# Altium footprint library Discretes.PcbLib: 81 footprints (part 2 of 6)
Each footprint in its own frame and in the unit in brackets; x right, y up, seen from the top. Pads: shape width x height; smd on the part's side, far side on the other; paste and mask are expansions set on the pad; w line width, h text height; cw(c..) or ccw(c..) is an arc to the next point about the centre after c.
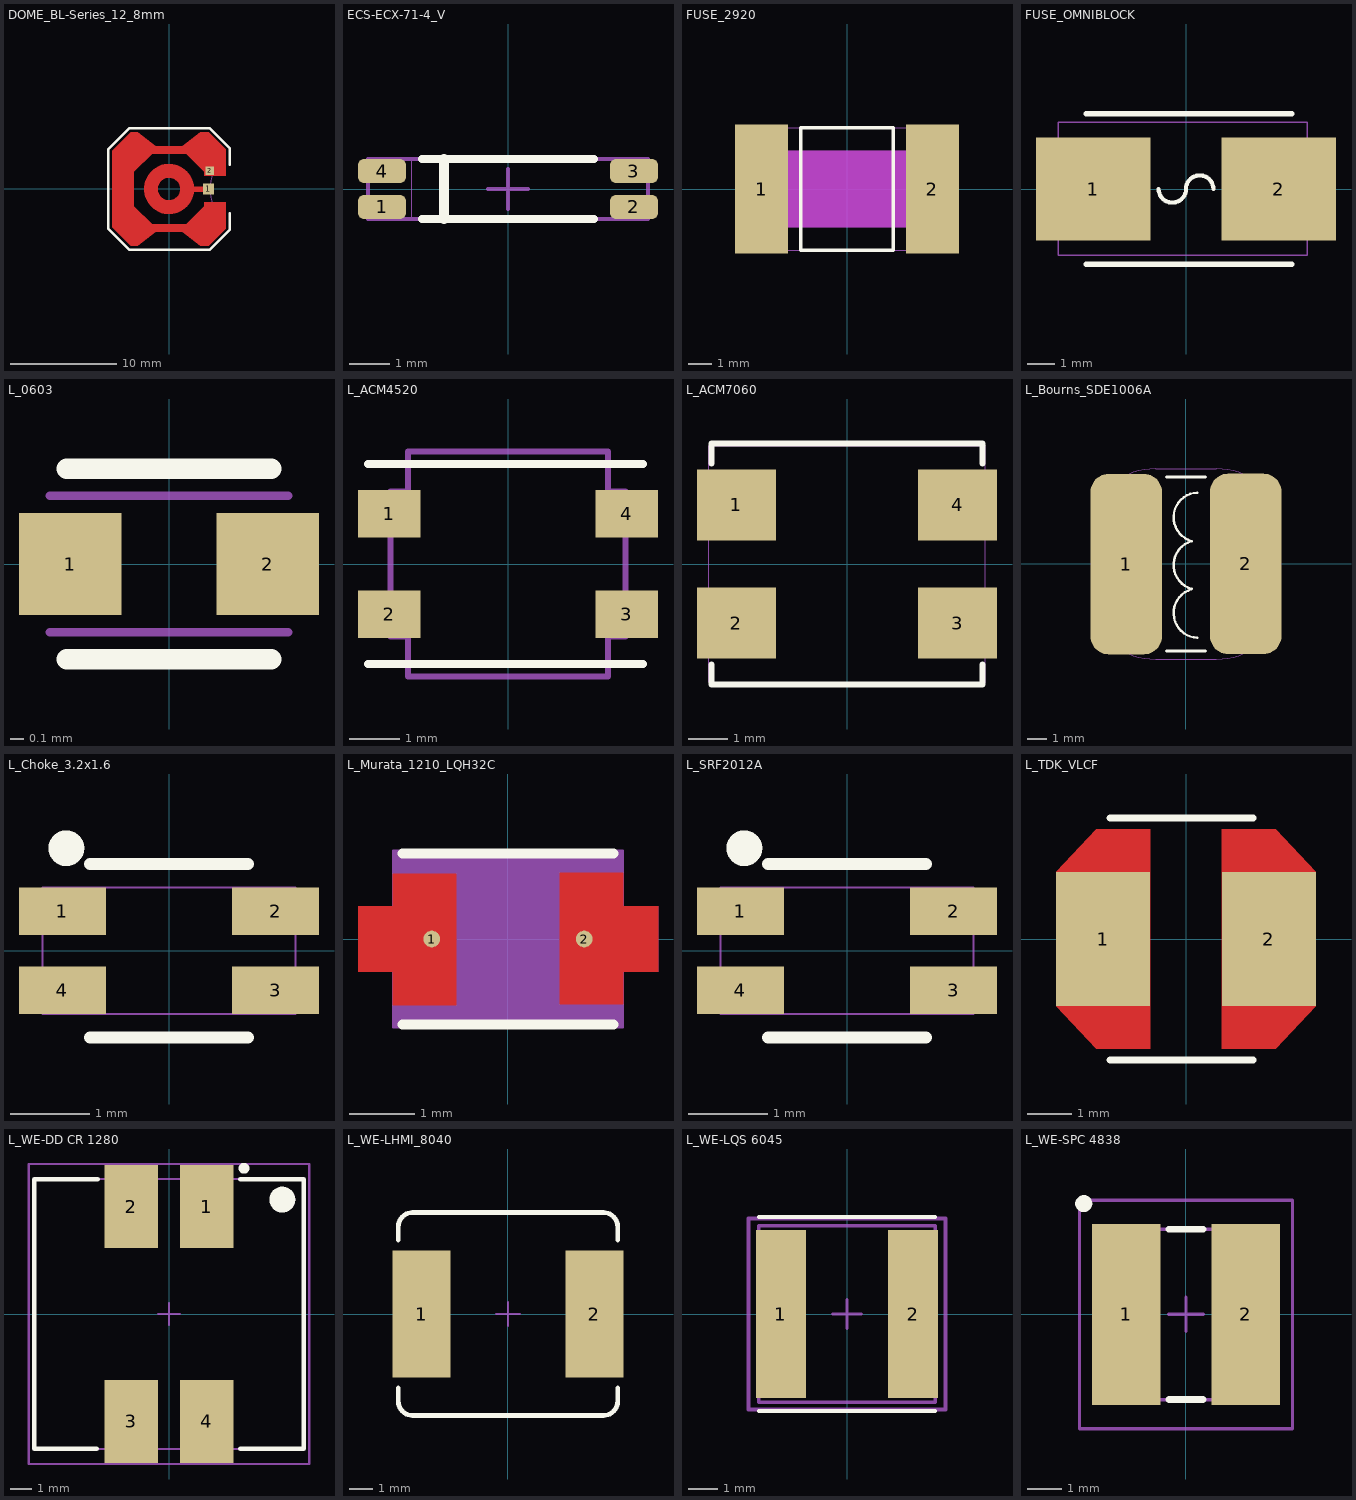
[diagram p1: the footprints below, top view; thin cyan lines are the x and y axes]

## DOME_BL-Series_12_8mm [mm] "Tactile Dome Switch wLED Hole 12mm and 8mm"
height 0.56
pads (2):
  rect 1x1 smd paste-1: 1(3.7,0)
  rect 0.8x0.8 smd paste-0.8 mask-0.8: 2(3.8,1.7)
Top Layer:
  circle w1.3: c0,0 r1.7
  rectangle: 2.1,-0.3 3.6,0.25
  region: 177 vertices and 0 holes, not listed, extent -5.313,-5.313 5.313,5.313
Top Overlay:
  lines w0.25: 5.7,-2.3 5.7,-3.8 3.8,-5.7 -3.7,-5.7 -5.7,-3.7 -5.7,3.7 -3.7,5.7 3.8,5.7 5.7,3.8 5.7,2.3
Top Solder:
  circle w4: c0,0 r0.5
  region: 4.3,0.6 1.9,0.6 1.9,-0.6 4.3,-0.6
Mechanical 1:
  circle w0.025: c0,0 r1.2
  lines w0.025: -4.998,-3.217 -3.216,-4.998 cw(c-0.004,-8.921) 3.225,-5.011 ; -4.99,-3.225 ccw(c-8.957,-0.01) -5.016,3.237 -3.238,5.015 ; -3.216,4.998 ccw(c-0.004,8.92) 3.225,5.011 ; 3.216,4.998 5.016,3.237 ccw(c8.96,0.003) 5.011,-3.225 ; 3.237,-5.016 5.016,-3.238
  text ".Designator" at -2.725,6.05 h1.52
3D body "DOME-BL12280.STEP": height 0.61, standoff 0, extent -5.016,-5.016 5.016,5.016
3D body "DOME-BL08260.STEP": height 0.51, standoff 0, extent -3.561,-3.561 3.561,3.561

## ECS-ECX-71-4_V [mm] "SMT Crystal, 4-Leads, Body 7x1.5mm (max)"
pads (4):
  rrect50% 1.2x0.6 smd: 1(-3.15,-0.45) 2(3.15,-0.45) 3(3.15,0.45) 4(-3.15,0.45)
Top Overlay:
  lines w0.2: -2.15,-0.75 2.15,-0.75 ; -2.15,0.75 2.15,0.75
  lines w0.25: -1.6,-0.75 -1.6,0.75
Mechanical 1:
  lines w0.025: -2.4,-0.75 -2.4,0.75
  lines w0.1: -3.5,-0.75 -3.5,0.75 3.5,0.75 3.5,-0.75 -3.5,-0.75
  text ".Designator" at -1.346,-0.242 h0.76
Mechanical 15:
  lines w0.1: -0.5,0 0.5,0 ; 0,-0.5 0,0.5
3D body: height 1.4, standoff 0, extent -3.556,-0.749 3.414,0.737
3D body: height 0.3, standoff 0, extent -3.589,0.389 -3.198,0.668
3D body: height 0.3, standoff 0, extent -3.574,-0.681 -3.183,-0.401
3D body: height 0.3, standoff 0, extent 3.162,0.389 3.553,0.668
3D body: height 0.3, standoff 0, extent 3.162,-0.676 3.553,-0.396
3D body: height 1.41, standoff 1.39, extent -2.76,-0.49 -1.701,0.511
3D body: height 1.41, standoff 1.39, extent 1.617,-0.465 2.676,0.536

## FUSE_2920 [mm] "Resistor 2920 package"
height 0.711
pads (2):
  rect 2.3x5.6 smd: 1(-3.7,0) 2(3.7,0)
Top Overlay:
  lines w0.152: -2,-2.65 -2,2.65 2,2.65 2,-2.65 -2,-2.65
Mechanical 1:
  lines w0.025: -2.7,-2.65 -2.7,2.65 ; 2.7,-2.65 2.7,2.65 ; -3.85,-2.65 -3.85,2.65 3.85,2.65 3.85,-2.65 -3.85,-2.65
  text ".Designator" at -1.6,3.1 h1.27
Mechanical 11:
  pour cut-out: 3.429,-1.651 3.861,-1.651 3.861,1.651 3.429,1.651 -3.683,1.651 -3.861,1.651 -3.861,1.143 -3.861,-1.194 -3.861,-1.651 -3.81,-1.651
Mechanical 29 keep-out:
  region: 2.54,1.651 -2.54,1.651 -2.54,-1.651 2.54,-1.651
  region: -2.413,-1.651 2.413,-1.651 2.413,1.651 -2.413,1.651
3D body "FUSE-2920.step": height 1, standoff 0, extent -3.85,-2.65 3.85,2.65

## FUSE_OMNIBLOCK [mil] "Fuse, Omni block"
height 116
pads (2):
  rect 167x150 smd: 1(-135.5,0) 2(135.5,0)
Top Overlay:
  lines w6: -40,0 ccw(c-20,0) 0,0 cw(c20,0) 40,0
  lines w8: -145.5,-110 154.5,-110 ; -145.5,110 154.5,110
Mechanical 1:
  lines w2: -186.39,-96.84 176.91,-96.84 176.91,97.59 -186.39,97.59 -186.39,-96.84
  text ".Designator" at -75.5,-22 h60
3D body "OMNI-BLOK littelfuse.step": height 150, standoff 0, extent -199,-99.01 188,99.02

## L_0603 [mil] "Inductor 0603 package"
height 31.5
pads (2):
  rect 30x30 smd: 1(-29,0) 2(29,0)
Top Overlay:
  lines w6: -30,-28 30,-28 ; -30,28 30,28
Mechanical 1:
  lines w2.5: -35,-20 35,-20 ; -35,20 35,20
  text ".Designator" at -17.19,-13.78 h25
3D body "V0603.STEP": height 35.43, standoff 0, extent -31.49,-15.74 31.5,15.75

## L_ACM4520 [mm] "Common mode inductor 2 line"
height 2
pads (4):
  rect 1.25x0.95 smd: 1(-2.375,1) 2(-2.375,-1) 3(2.375,-1) 4(2.375,1)
Top Overlay:
  lines w0.152: -2.8,-2 2.7,-2 ; -2.8,2 2.7,2
Mechanical 1:
  lines w0.127: -2.35,-1.45 -2.35,1.45 -2,1.45 -2,2.25 2,2.25 2,1.45 2.35,1.45 2.35,-1.45 2,-1.45 2,-2.25 -2,-2.25 -2,-1.45 -2.35,-1.45
  text ".Designator" at -0.45,-0.2 h0.79
3D body: height 2, standoff 0, extent -2.35,-2.25 2.35,2.25

## L_ACM7060 [mm] "Common mode inductor 2 line"
height 3.5
pads (4):
  rect 2x1.8 smd: 1(-2.8,1.5) 2(-2.8,-1.5) 3(2.8,-1.5) 4(2.8,1.5)
Top Overlay:
  lines w0.152: -3.429,-2.54 -3.429,-3.048 3.429,-3.048 3.429,-2.54 ; -3.429,2.54 -3.429,3.048 3.429,3.048 3.429,2.54
Mechanical 1:
  lines w0.025: -3.5,-3 -3.5,3 3.5,3 3.5,-3 -3.5,-3 ; -3.5,-2.25 -2,-2.25 -2,-0.75 -3.5,-0.75 -3.5,-2.25 ; -3.5,0.75 -3.5,2.25 -2,2.25 -2,0.75 -3.5,0.75 ; 2,-2.25 3.5,-2.25 3.5,-0.75 2,-0.75 2,-2.25 ; 2,0.75 3.5,0.75 3.5,2.25 2,2.25 2,0.75
  text ".Designator" at -1.27,-0.254 h0.79
3D body "TDK_ACM7060.step": height 3.5, standoff 0, extent -3.5,-3 3.5,3

## L_Bourns_SDE1006A [mm] "Power Inductor  Bourns Serie  - SDE1006A -"
height 5.8
pads (2):
  rrect50% 3.77x9.5 smd: 1(-3.144,-0.007) 2(3.144,0.007)
Top Overlay:
  lines w0.127: 0.29,-1.332 ccw(c0.65,-2.584) 0.602,-3.886 ; 0.29,1.197 ccw(c0.65,-0.055) 0.307,-1.312 ; 0.307,1.2 cw(c0.65,2.457) 0.601,3.759
  lines w0.152: -1.016,-4.572 1.016,-4.572 ; -1.016,4.572 1.016,4.572
Mechanical 1:
  lines w0.025: -4.9,1.551 ccw(c-4.064,1.522) -4.064,0.686 cw(c-4.064,0.457) -3.835,0.457 -3.835,-0.457 cw(c-4.064,-0.457) -4.064,-0.686 ccw(c-4.064,-1.522) -4.9,-1.522 -4.9,-1.885 ccw(c-1.693,-1.793) -1.601,-5 1.601,-5 ; -4.9,1.552 -4.9,1.885 cw(c-1.693,1.793) -1.601,5 1.601,5 ; -1.575,5 1.601,5 cw(c1.693,1.793) 4.9,1.885 4.9,1.552 ; 1.601,-5 ccw(c1.693,-1.793) 4.9,-1.885 4.9,-1.522 ccw(c4.064,-1.522) 4.064,-0.686 cw(c4.064,-0.457) 3.835,-0.457 3.835,0.457 cw(c4.064,0.457) 4.064,0.686 ccw(c4.064,1.522) 4.9,1.551
  text ".Designator" at -2.565,-1.041 h1.52
3D body "Bourns_SRN1060.step": height 6.1, standoff 0, extent -4.9,-5 4.9,5

## L_Choke_3.2x1.6 [mm] "Common mode chip inductor 2 line"
height 1.6
pads (4):
  rect 1.1x0.6 smd: 1(-1.35,0.5) 2(1.35,0.5) 3(1.35,-0.5) 4(-1.35,-0.5)
Top Overlay:
  circle w0.254: c-1.3,1.3 r0.1
  lines w0.152: -1,-1.1 1,-1.1 ; -1,1.1 1,1.1
Mechanical 1:
  circle w0.254: c-1.2,0.5 r0.05
  lines w0.025: -1.6,-0.8 -1.6,0.8 1.6,0.8 1.6,-0.8 -1.6,-0.8
  text ".Designator" at -0.7,-0.3 h0.79
3D body: height 1.8, standoff 0, extent -1.6,-0.8 1.6,0.8

## L_Murata_1210_LQH32C [mil] "Chip power inductor"
height 87
pads (2):
  round 10 smd: 1(-45.59,0) 2(45.59,0)
Top Layer:
  region: 31.1,39.76 68.9,39.76 68.9,19.69 89.76,19.69 89.76,-19.68 68.9,-19.68 68.9,-38.98 31.1,-38.98
  region: -31.1,-39.76 -68.9,-39.76 -68.9,-19.68 -89.76,-19.68 -89.76,19.69 -68.9,19.69 -68.9,38.98 -31.1,38.98
Top Overlay:
  lines w6: -62.99,-51.18 62.99,-51.18 ; -62.99,51.18 62.99,51.18
Top Paste:
  region: 31.1,39.76 68.9,39.76 68.9,19.69 89.76,19.69 89.76,-19.68 68.9,-19.68 68.9,-38.98 31.1,-38.98
  region: -31.1,-39.76 -68.9,-39.76 -68.9,-19.68 -89.76,-19.68 -89.76,19.69 -68.9,19.69 -68.9,38.98 -31.1,38.98
Top Solder:
  region: 31.1,39.76 68.9,39.76 68.9,19.69 89.76,19.69 89.76,-19.68 68.9,-19.68 68.9,-38.98 31.1,-38.98
  region: -31.1,-39.76 -68.9,-39.76 -68.9,-19.68 -89.76,-19.68 -89.76,19.69 -68.9,19.69 -68.9,38.98 -31.1,38.98
Mechanical 1:
  lines w1: -68.9,-53.15 -51.18,-53.15 -45.28,-47.24 -25.59,-53.15 25.59,-53.15 45.28,-47.24 51.18,-53.15 68.9,-53.15 68.9,53.15 51.18,53.15 45.28,47.24 25.59,53.15 -25.59,53.15 -45.28,47.24 -51.18,53.15 -68.9,53.15 -68.9,-53.15 ; -51.18,-39.37 51.18,-39.37 51.18,39.37 -51.18,39.37 -51.18,-39.37
  text ".Designator" at -27.56,-15.75 h39.37
Mechanical 11:
  pour cut-out: -68.9,-53.15 68.9,-53.15 68.9,-19.68 89.76,-19.68 89.76,19.69 68.9,19.69 68.9,53.15 -68.9,53.15 -68.9,19.69 -89.76,19.69 -89.76,-19.68 -68.9,-19.68
3D body "LQH32M-1.step": height 76.77, standoff -1.97, extent -57.73,-48.73 68.25,49.7

## L_SRF2012A [mm] "Common mode chip inductor 2 line"
height 1.2
pads (4):
  rect 1.1x0.6 smd: 1(-1.35,0.5) 2(1.35,0.5) 3(1.35,-0.5) 4(-1.35,-0.5)
Top Overlay:
  circle w0.254: c-1.3,1.3 r0.1
  lines w0.152: -1,-1.1 1,-1.1 ; -1,1.1 1,1.1
Mechanical 1:
  circle w0.254: c-1.2,0.5 r0.05
  lines w0.025: -1.6,-0.8 -1.6,0.8 1.6,0.8 1.6,-0.8 -1.6,-0.8
  text ".Designator" at -0.7,-0.3 h0.79
3D body: height 1.8, standoff 0, extent -1.6,-0.8 1.6,0.8

## L_TDK_VLCF [mm] "Power inductor"
height 2
pads (2):
  rect 2.1x3 smd paste+0 mask+0: 1(-1.85,0) 2(1.85,0)
Top Layer:
  region: 0.8,2.45 2,2.45 2.9,1.5 2.9,-1.5 2,-2.45 0.8,-2.45
  region: -0.8,2.45 -2,2.45 -2.9,1.5 -2.9,-1.5 -2,-2.45 -0.8,-2.45
Top Overlay:
  lines w0.152: -1.7,-2.7 1.5,-2.7 ; -1.7,2.7 1.5,2.7
3D body: height 2, standoff 0, extent -2.625,-2.5 2.625,2.5

## L_WE-DD CR 1280 [mm] "SMD Inductor, 4-Leads, Body 12.5x12.5mm (max)"
height 8.5
pads (4):
  rect 2.5x3.85 smd: 1(1.75,4.975) 2(-1.75,4.975) 3(-1.75,-4.975) 4(1.75,-4.975)
Top Overlay:
  circle w0.6: c5.25,5.3 r0.3
  circle w0.25: c3.475,6.75 r0.125
  lines w0.2: -6.25,-6.25 -6.25,6.25 -3.3,6.25 ; -6.2,-6.25 -3.35,-6.25 ; 3.3,-6.25 6.25,-6.25 6.25,6.25 3.3,6.25
Mechanical 1:
  circle w0.1: c5.3,5.3 r0.5
  lines w0.1: -6.25,-6.25 -6.25,6.25 6.25,6.25 6.25,-6.25 -6.25,-6.25
Mechanical 15:
  lines w0.1: -0.5,0 0.5,0 ; 0,-0.5 0,0.5 ; -6.5,-6.95 -6.5,6.95 6.5,6.95 6.5,-6.95 -6.5,-6.95
3D body "WE-DD_1280_Crossed.stp": height 8.6, standoff 0, extent -6.25,-6.25 6.25,6.25

## L_WE-LHMI_8040 [mm] "SMD Power Inductor, body 9.2x8.5"
height 4
pads (2):
  rect 2.42x5.33 smd: 1(-3.62,0) 2(3.62,0)
Top Overlay:
  lines w0.2: -4.6,-3.1 -4.6,-3.65 ccw(c-4,-3.65) -4,-4.25 4,-4.25 ccw(c4,-3.65) 4.6,-3.65 4.6,-3.1 ; -4.6,3.1 -4.6,3.65 cw(c-4,3.65) -4,4.25 4,4.25 cw(c4,3.65) 4.6,3.65 4.6,3.1
Mechanical 15:
  lines w0.1: -0.5,0 0.5,0 ; 0,-0.5 0,0.5
3D body "IndLHMI_8040.stp": height 4, standoff 0, extent -4.725,-4.1 4.725,4.1

## L_WE-LQS 6045 [mm] "SMD Power Inductor, 2-Leads, Body 6.0x6.0mm"
height 4.5
pads (2):
  rect 1.7x5.7 smd: 1(-2.25,0) 2(2.25,0)
Top Overlay:
  lines w0.127: -3,-3.3 3,-3.3 ; -3,3.3 3,3.3
Mechanical 1:
  text ".Designator" at -0.875,-0.475 h1
Mechanical 13:
  lines w0.127: -3,-3 -3,3 3,3 3,-3 -3,-3
Mechanical 15:
  lines w0.1: -0.5,0 0.5,0 ; 0,-0.5 0,0.5
  lines w0.127: -3.35,-3.25 -3.35,3.25 3.35,3.25 3.35,-3.25 -3.35,-3.25
3D body "LQS_6045.stp": height 4.47, standoff -0.03, extent -3,-3 3,3

## L_WE-SPC 4838 [mm] "SMD Inductor, 2- pin, Body 4.80 x 4.80mm"
height 3.8
pads (2):
  rect 2x5.3 smd: 1(-1.75,0) 2(1.75,0)
Top Overlay:
  circle w0.25: c-3,3.25 r0.125
  lines w0.2: -0.5,-2.5 0.5,-2.5 ; -0.5,2.5 0.5,2.5
Mechanical 1:
  region: 2.2,2.3 1.2,2.3 1.2,-2.3 2.2,-2.3
  rectangle: -2.2,-2.3 -1.2,2.3
  lines w0.1: -2.35,-2.5 2.35,-2.5 2.35,2.5 -2.35,2.5 -2.35,-2.5
  text ".Designator" at -0.8,-0.6 h1
Mechanical 15:
  lines w0.1: -0.5,0 0.5,0 ; 0,-0.5 0,0.5 ; -3.125,-3.35 3.125,-3.35 3.125,3.35 -3.125,3.35 -3.125,-3.35
3D body "WE-SPC_4838.stp": height 3.8, standoff -0.01, extent -2.41,-2.41 2.41,2.41